# Altium footprint library Generic Footprint.PcbLib: 160 footprints (part 4 of 20)
Each footprint in its own frame and in the unit in brackets; x right, y up, seen from the top. Pads: shape width x height; smd on the part's side, far side on the other; paste and mask are expansions set on the pad; w line width, h text height; cw(c..) or ccw(c..) is an arc to the next point about the centre after c.
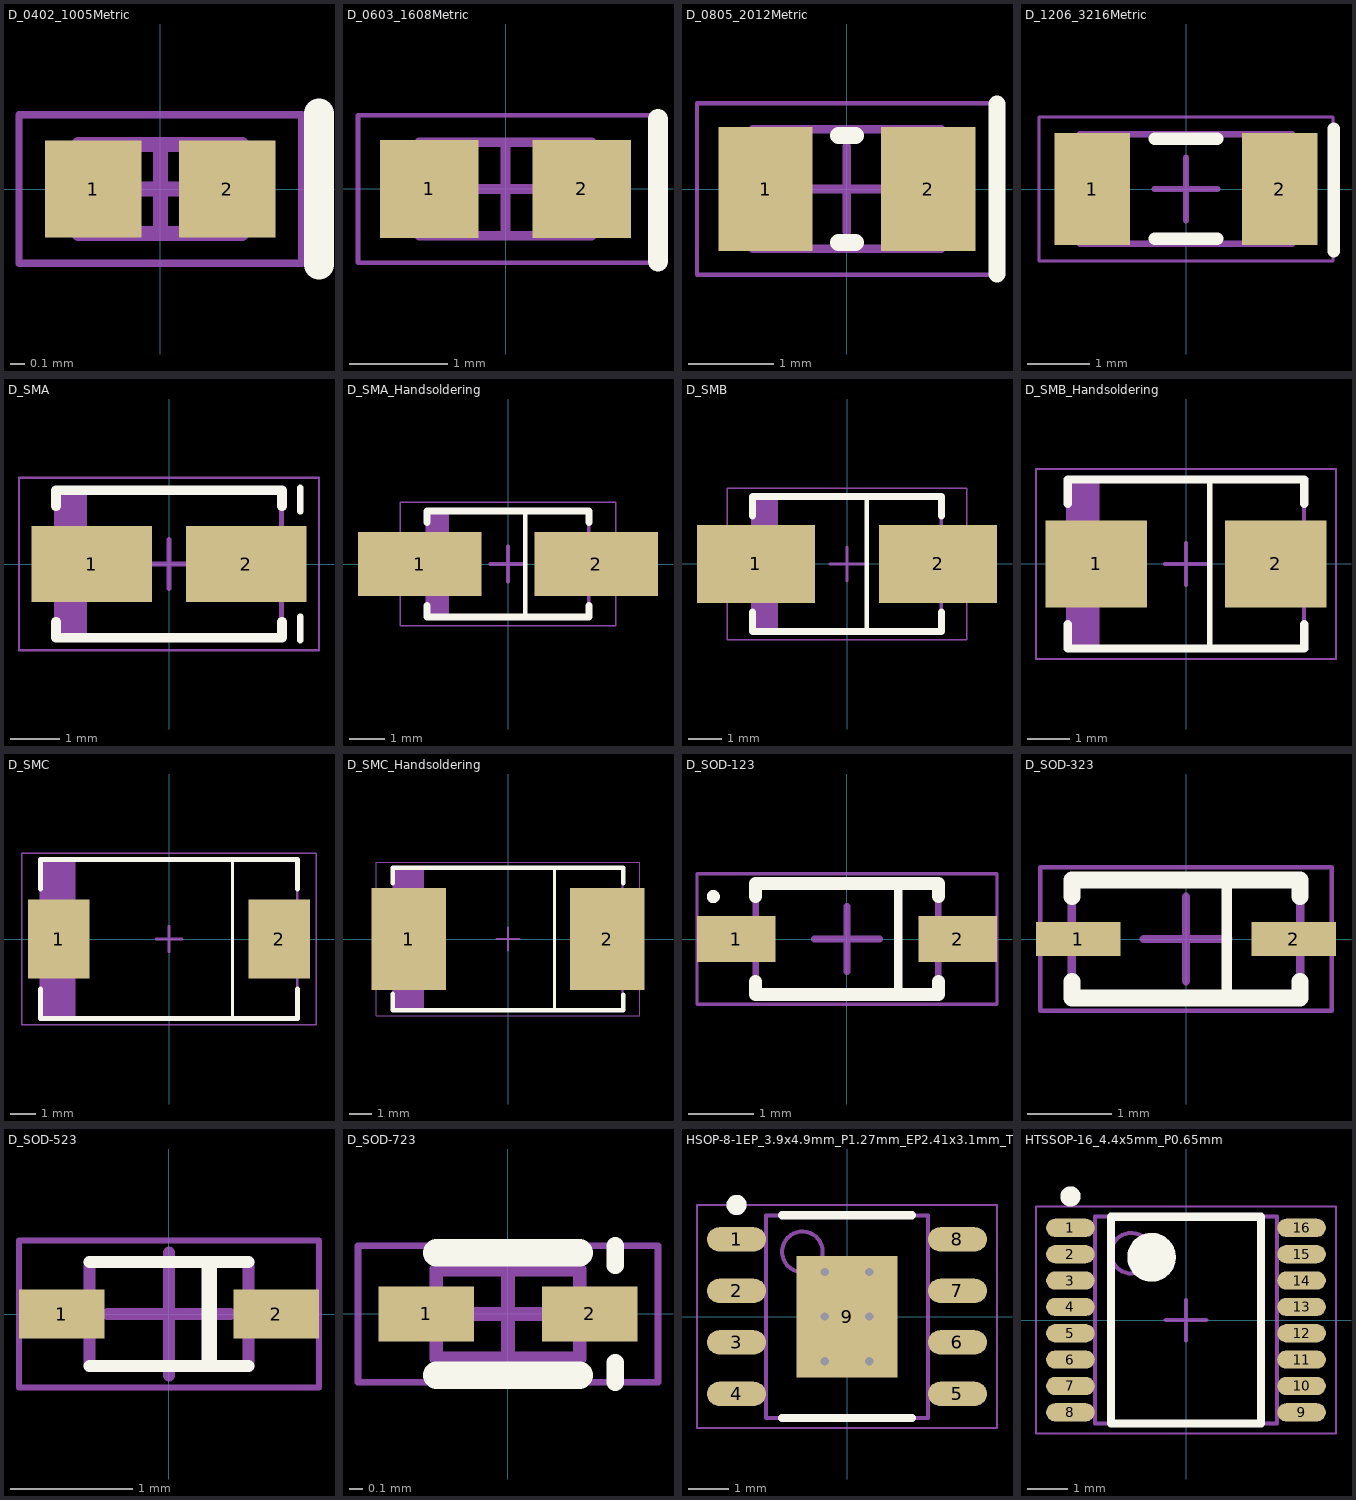
[diagram p3: the footprints below, top view; thin cyan lines are the x and y axes]

## D_0402_1005Metric [mm]
height 0.3
pads (2):
  rect 0.65x0.65 smd: 1(-0.45,0) 2(0.45,0)
Top Overlay:
  lines w0.203: 1.067,-0.508 1.067,0.508
Courtyard Top:
  lines w0.05: -0.95,-0.5 0.95,-0.5 0.95,0.5 -0.95,0.5 -0.95,-0.5
  lines w0.1: -0.3,0 0.3,0 ; 0,-0.3 0,0.3
Assembly Top:
  lines w0.1: -0.55,-0.3 0.55,-0.3 0.55,0.3 -0.55,0.3 -0.55,-0.3
3D body "D_0402_1005Metric.step": height 0.3, standoff 0, extent -0.55,-0.3 0.55,0.3

## D_0603_1608Metric [mm]
height 0.5
pads (2):
  rect 1x1 smd: 1(-0.775,0) 2(0.775,0)
Top Overlay:
  lines w0.203: 1.549,-0.737 1.549,0.711
Courtyard Top:
  lines w0.05: -1.5,-0.75 -1.5,0.75 1.5,0.75 1.5,-0.75 -1.5,-0.75
  lines w0.1: -0.475,0 0.475,0 ; 0,-0.475 0,0.475
Assembly Top:
  lines w0.1: -0.875,-0.475 -0.875,0.475 0.875,0.475 0.875,-0.475 -0.875,-0.475
3D body "D_0603_1608Metric.step": height 0.5, standoff 0, extent -0.875,-0.475 0.875,0.475

## D_0805_2012Metric [mm]
height 0.6
pads (2):
  rect 1.1x1.45 smd: 1(-0.95,0) 2(0.95,0)
Top Overlay:
  lines w0.2: -0.1,-0.625 0.1,-0.625 ; -0.1,0.625 0.1,0.625
  lines w0.203: 1.753,-0.991 1.753,0.991
Courtyard Top:
  lines w0.05: -1.75,-1 -1.75,1 1.75,1 1.75,-1 -1.75,-1
  lines w0.1: -0.5,0 0.5,0 ; 0,-0.5 0,0.5
Assembly Top:
  lines w0.1: -1.1,-0.7 -1.1,0.7 1.1,0.7 1.1,-0.7 -1.1,-0.7
3D body "D_0805_2012Metric.step": height 0.6, standoff 0, extent -1.1,-0.7 1.1,0.7

## D_1206_3216Metric [mm]
height 0.65
pads (2):
  rect 1.2x1.8 smd: 1(-1.5,0) 2(1.5,0)
Top Overlay:
  lines w0.2: -0.5,-0.8 0.5,-0.8 ; -0.5,0.8 0.5,0.8
  lines w0.203: 2.362,-0.991 2.362,0.965
Courtyard Top:
  lines w0.05: -2.35,-1.15 -2.35,1.15 2.35,1.15 2.35,-1.15 -2.35,-1.15
  lines w0.1: -0.5,0 0.5,0 ; 0,-0.5 0,0.5
Assembly Top:
  lines w0.1: -1.7,-0.875 -1.7,0.875 1.7,0.875 1.7,-0.875 -1.7,-0.875
3D body "D_1206_3216Metric.step": height 0.65, standoff 0, extent -1.7,-0.875 1.7,0.875

## D_SMA [mm] "Molded Diode, 2-Leads, Body 4.31x2.61mm, IPC Medium Density"
height 2.62
pads (2):
  rect 2.45x1.55 smd: 1(-1.575,0) 2(1.575,0)
Top Overlay:
  lines w0.127: 2.667,-1.549 2.667,-1.067 ; 2.667,1.067 2.667,1.549
  lines w0.2: -2.3,-1.175 -2.3,-1.5 2.3,-1.5 2.3,-1.175 ; -2.3,1.175 -2.3,1.5 2.3,1.5 2.3,1.175
Courtyard Top:
  lines w0.05: -3.05,-1.75 -3.05,1.75 3.05,1.75 3.05,-1.75 -3.05,-1.75
  lines w0.1: -0.5,0 0.5,0 ; 0,-0.5 0,0.5
Assembly Top:
  rectangle: -2.285,-1.46 -1.67,1.46
  lines w0.1: -2.285,-1.46 -2.285,1.46 2.285,1.46 2.285,-1.46 -2.285,-1.46
3D body "D_SMA.step": height 2.62, standoff 0, extent -2.505,-1.46 2.505,1.46

## D_SMA_Handsoldering [mm] "Molded Diode, 2-Leads, Body 4.31x2.61mm, IPC Medium Density"
height 2.62
pads (2):
  rect 3.5x1.8 smd: 1(-2.5,0) 2(2.5,0)
Top Overlay:
  lines w0.127: 0.483,-1.499 0.483,1.475
  lines w0.2: -2.3,-1.175 -2.3,-1.5 2.3,-1.5 2.3,-1.175 ; -2.3,1.175 -2.3,1.5 2.3,1.5 2.3,1.175
Courtyard Top:
  lines w0.05: -3.05,-1.75 -3.05,1.75 3.05,1.75 3.05,-1.75 -3.05,-1.75
  lines w0.1: -0.5,0 0.5,0 ; 0,-0.5 0,0.5
Assembly Top:
  rectangle: -2.285,-1.46 -1.67,1.46
  lines w0.1: -2.285,-1.46 -2.285,1.46 2.285,1.46 2.285,-1.46 -2.285,-1.46
3D body "D_SMA.step": height 2.62, standoff 0, extent -2.505,-1.46 2.505,1.46

## D_SMB [mm]
height 2.62
pads (2):
  rect 3.5x2.3 smd: 1(-2.7,0) 2(2.7,0)
Top Overlay:
  lines w0.127: 0.584,-2 0.584,1.97
  lines w0.2: -2.8,-1.425 -2.8,-2 2.8,-2 2.8,-1.425 ; -2.8,1.425 -2.8,2 2.8,2 2.8,1.425
Courtyard Top:
  lines w0.05: -3.55,-2.25 3.55,-2.25 3.55,2.25 -3.55,2.25 -3.55,-2.25
  lines w0.1: -0.5,0 0.5,0 ; 0,-0.5 0,0.5
Assembly Top:
  rectangle: -2.795,-1.97 -2.043,1.97
  lines w0.1: -2.795,-1.97 2.795,-1.97 2.795,1.97 -2.795,1.97 -2.795,-1.97
3D body "D_SMB.step": height 2.62, standoff 0, extent -3.015,-1.97 3.015,1.97

## D_SMB_Handsoldering [mm]
height 2.62
pads (2):
  rect 2.4x2.05 smd: 1(-2.125,0) 2(2.125,0)
Top Overlay:
  lines w0.127: 0.559,-2.007 0.559,2.007
  lines w0.2: -2.8,-1.425 -2.8,-2 2.8,-2 2.8,-1.425 ; -2.8,1.425 -2.8,2 2.8,2 2.8,1.425
Courtyard Top:
  lines w0.05: -3.55,-2.25 3.55,-2.25 3.55,2.25 -3.55,2.25 -3.55,-2.25
  lines w0.1: -0.5,0 0.5,0 ; 0,-0.5 0,0.5
Assembly Top:
  rectangle: -2.795,-1.97 -2.043,1.97
  lines w0.1: -2.795,-1.97 2.795,-1.97 2.795,1.97 -2.795,1.97 -2.795,-1.97
3D body "D_SMB.step": height 2.62, standoff 0, extent -3.015,-1.97 3.015,1.97

## D_SMC [mm]
height 2.62
pads (2):
  rect 2.45x3.15 smd: 1(-4.375,0) 2(4.375,0)
Top Overlay:
  lines w0.127: 2.515,-3.15 2.515,3.15
  lines w0.2: -5.1,-1.975 -5.1,-3.15 5.1,-3.15 5.1,-1.975 ; -5.1,1.975 -5.1,3.15 5.1,3.15 5.1,1.975
Courtyard Top:
  lines w0.05: -5.85,-3.4 5.85,-3.4 5.85,3.4 -5.85,3.4 -5.85,-3.4
  lines w0.1: -0.5,0 0.5,0 ; 0,-0.5 0,0.5
Assembly Top:
  rectangle: -5.08,-3.11 -3.713,3.11
  lines w0.1: -5.08,-3.11 5.08,-3.11 5.08,3.11 -5.08,3.11 -5.08,-3.11
3D body "D_SMC.step": height 2.62, standoff 0, extent -5.3,-3.11 5.3,3.11

## D_SMC_Handsoldering [mm]
height 2.62
pads (2):
  rect 3.3x4.5 smd: 1(-4.4,0) 2(4.4,0)
Top Overlay:
  lines w0.127: 2.057,-3.175 2.057,3.15
  lines w0.2: -5.1,-2.438 -5.1,-3.15 5.1,-3.15 5.1,-2.464 ; -5.1,2.464 -5.1,3.15 5.1,3.15 5.1,2.464
Courtyard Top:
  lines w0.05: -5.85,-3.4 -5.85,3.4 5.85,3.4 5.85,-3.4 -5.85,-3.4
  lines w0.1: -0.5,0 0.5,0 ; 0,-0.5 0,0.5
Assembly Top:
  rectangle: -5.08,-3.11 -3.713,3.11
  lines w0.1: -5.08,-3.11 -5.08,3.11 5.08,3.11 5.08,-3.11 -5.08,-3.11
3D body "D_SMC.step": height 2.62, standoff 0, extent -5.3,-3.11 5.3,3.11

## D_SOD-123 [mm] "SODFL, 2-Leads, Body 1.60x3.70mm, IPC Medium Density"
height 0.1
pads (2):
  rect 1.2x0.7 smd: 1(-1.7,0) 2(1.7,0)
Top Overlay:
  circle w0.1: c-2.05,0.65 r0.05
  lines w0.127: 0.787,-0.889 0.787,0.838
  lines w0.2: -1.4,-0.65 -1.4,-0.85 1.4,-0.85 1.4,-0.65 ; -1.4,0.65 -1.4,0.85 1.4,0.85 1.4,0.65
Courtyard Top:
  lines w0.05: -2.3,-1 2.3,-1 2.3,1 -2.3,1 -2.3,-1
  lines w0.1: -0.5,0 0.5,0 ; 0,-0.5 0,0.5
Assembly Top:
  lines w0.1: -1.4,-0.85 1.4,-0.85 1.4,0.85 -1.4,0.85 -1.4,-0.85
3D body "D_SOD-123.step": height 0.2, standoff 0, extent -1.85,-0.85 1.85,0.85

## D_SOD-323 [mm]
height 1
pads (2):
  rect 1x0.4 smd: 1(-1.275,0) 2(1.275,0)
Top Overlay:
  lines w0.127: 0.483,-0.7 0.483,0.686
  lines w0.2: -1.35,-0.5 -1.35,-0.7 1.35,-0.7 1.35,-0.5 ; -1.35,0.5 -1.35,0.7 1.35,0.7 1.35,0.5
Courtyard Top:
  lines w0.05: -1.725,-0.85 -1.725,0.85 1.725,0.85 1.725,-0.85 -1.725,-0.85
  lines w0.1: -0.5,0 0.5,0 ; 0,-0.5 0,0.5
Assembly Top:
  lines w0.1: -1.35,-0.7 -1.35,0.7 1.35,0.7 1.35,-0.7 -1.35,-0.7
3D body "D_SOD-323.step": height 1, standoff 0, extent -1.35,-0.7 1.35,0.7

## D_SOD-523 [mm]
height 0.77
pads (2):
  rect 0.7x0.4 smd: 1(-0.875,0) 2(0.875,0)
Top Overlay:
  lines w0.1: -0.65,-0.425 0.65,-0.425 ; -0.65,0.425 0.65,0.425
  lines w0.127: 0.33,-0.406 0.33,0.406
Courtyard Top:
  lines w0.05: -1.225,-0.6 -1.225,0.6 1.225,0.6 1.225,-0.6 -1.225,-0.6
  lines w0.1: -0.5,0 0.5,0 ; 0,-0.5 0,0.5
Assembly Top:
  lines w0.1: -0.65,-0.425 -0.65,0.425 0.65,0.425 0.65,-0.425 -0.65,-0.425
3D body "D_SOD-523.step": height 0.77, standoff 0, extent -0.8,-0.425 0.8,0.425

## D_SOD-723 [mm] "SODFL, 2-Leads, Body 0.60x1.40mm, IPC Medium Density"
height 0.55
pads (2):
  rect 0.7x0.4 smd: 1(-0.6,0) 2(0.6,0)
Top Overlay:
  lines w0.127: 0.787,-0.5 0.787,-0.356 ; 0.787,0.356 0.787,0.5
  lines w0.2: -0.525,-0.45 0.525,-0.45 ; -0.525,0.45 0.525,0.45
Courtyard Top:
  lines w0.05: -1.1,-0.5 -1.1,0.5 1.1,0.5 1.1,-0.5 -1.1,-0.5
  lines w0.1: -0.5,0 0.5,0 ; 0,-0.5 0,0.5
Assembly Top:
  lines w0.1: -0.525,-0.325 -0.525,0.325 0.525,0.325 0.525,-0.325 -0.525,-0.325
3D body "D_SOD-723.step": height 0.55, standoff 0, extent -0.7,-0.325 0.7,0.325

## HSOP-8-1EP_3.9x4.9mm_P1.27mm_EP2.41x3.1mm_ThermalVias [mm] "SOP, 8-Leads, Body 4.90x3.90mm, Pitch 1.27mm, Thermal Pad 3.00x2.49mm, IPC Medium Density"
height 1.7
pads (9):
  oval 1.45x0.6 smd: 1(-2.725,1.905) 2(-2.725,0.635) 3(-2.725,-0.635) 4(-2.725,-1.905) 5(2.725,-1.905) 6(2.725,-0.635) 7(2.725,0.635) 8(2.725,1.905)
  rect 2.49x3 smd: 9(0,0)
via 0.55,-1.1 diameter 0.5 hole 0.2
via -0.55,-1.1 diameter 0.5 hole 0.2
via 0.55,0 diameter 0.5 hole 0.2
via -0.55,0 diameter 0.5 hole 0.2
via 0.55,1.1 diameter 0.5 hole 0.2
via -0.55,1.1 diameter 0.5 hole 0.2
Top Overlay:
  circle w0.25: c-2.725,2.755 r0.125
  lines w0.2: -1.6,-2.5 1.6,-2.5 ; -1.6,2.5 1.6,2.5
Courtyard Top:
  lines w0.05: -3.7,-2.75 3.7,-2.75 3.7,2.75 -3.7,2.75 -3.7,-2.75
  lines w0.1: -0.5,0 0.5,0 ; 0,-0.5 0,0.5
Assembly Top:
  circle w0.1: c-1.1,1.6 r0.5
  lines w0.1: -2,-2.5 2,-2.5 2,2.5 -2,2.5 -2,-2.5
3D body "HSOP-8-1EP_3.9x4.9mm_P1.27mm_EP2.41x3.1mm_ThermalVias.step": height 1.7, standoff 0, extent -3,-2.5 3,2.5

## HTSSOP-16_4.4x5mm_P0.65mm [mm] "TSOP, 16-Leads, Body 5.00x4.40mm, Pitch 0.65mm, IPC Medium Density"
height 1.2
pads (16):
  oval 1.2x0.45 smd: 1(-2.85,2.275) 2(-2.85,1.625) 3(-2.85,0.975) 4(-2.85,0.325) 5(-2.85,-0.325) 6(-2.85,-0.975) 7(-2.85,-1.625) 8(-2.85,-2.275) 9(2.85,-2.275) 10(2.85,-1.625) 11(2.85,-0.975) 12(2.85,-0.325) 13(2.85,0.325) 14(2.85,0.975) 15(2.85,1.625) 16(2.85,2.275)
Top Overlay:
  circle w0.25: c-2.85,3.05 r0.125
  circle w0.6: c-0.85,1.55 r0.3
  lines w0.2: -1.85,-2.55 -1.85,2.55 1.85,2.55 1.85,-2.55 -1.85,-2.55
Courtyard Top:
  lines w0.05: -3.7,-2.8 -3.7,2.8 3.7,2.8 3.7,-2.8 -3.7,-2.8
  lines w0.1: -0.5,0 0.5,0 ; 0,-0.5 0,0.5
Assembly Top:
  circle w0.1: c-1.35,1.65 r0.5
  lines w0.1: -2.25,-2.55 -2.25,2.55 2.25,2.55 2.25,-2.55 -2.25,-2.55
3D body "HTSSOP-16_4.4x5mm_P0.65mm.step": height 1.2, standoff 0, extent -3,-2.55 3,2.55